# Altium footprint library HEAD10-5.08.PcbLib: 2 footprints
Each footprint in its own frame and in the unit in brackets; x right, y up, seen from the top. Pads: shape width x height; smd on the part's side, far side on the other; paste and mask are expansions set on the pad; w line width, h text height; cw(c..) or ccw(c..) is an arc to the next point about the centre after c.
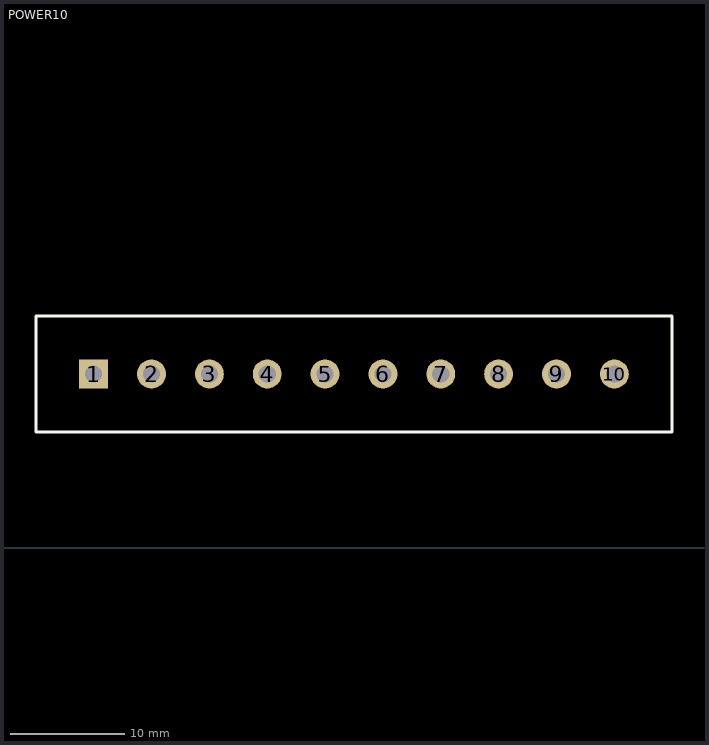
[diagram p0: the footprints below, top view; thin cyan lines are the x and y axes]

## PCBComponent_1 [mil]

## POWER10 [mm]
pads (10):
  rect 2.54x2.54 hole 1.5: 1(-60.96,15.24)
  round 2.54 hole 1.5: 2(-55.88,15.24) 3(-50.8,15.24) 4(-45.72,15.24) 5(-40.64,15.24) 6(-35.56,15.24) 7(-30.48,15.24) 8(-25.4,15.24) 9(-20.32,15.24) 10(-15.24,15.24)
Top Overlay:
  lines w0.254: -66.04,10.16 -66.04,20.32 -10.16,20.32 -10.16,10.16 -66.04,10.16